# Altium footprint library vmorais_libraries.PcbLib: 95 footprints (part 5 of 6)
Each footprint in its own frame and in the unit in brackets; x right, y up, seen from the top. Pads: shape width x height; smd on the part's side, far side on the other; paste and mask are expansions set on the pad; w line width, h text height; cw(c..) or ccw(c..) is an arc to the next point about the centre after c.
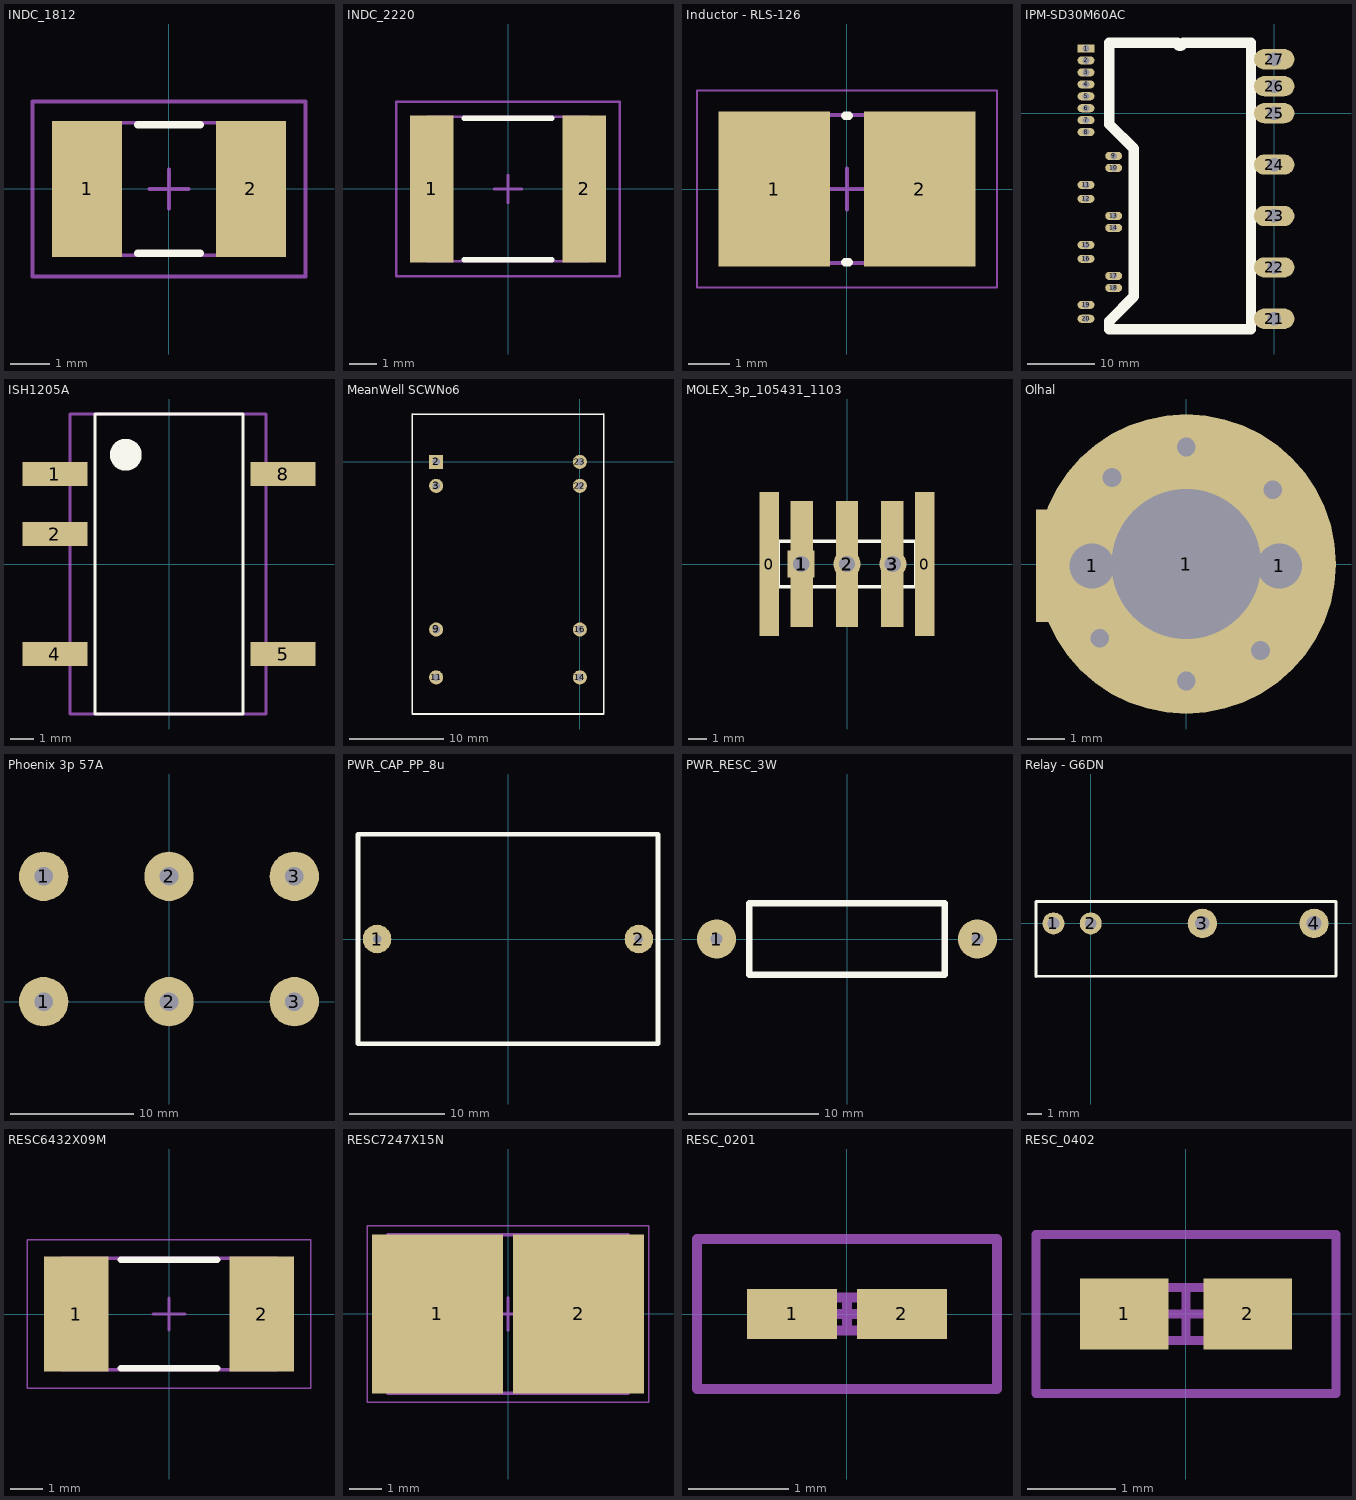
[diagram p4: the footprints below, top view; thin cyan lines are the x and y axes]

## INDC_1812 [mm] "Chip Inductor, Body 4.5x3.2mm, IPC Low Density"
height 1.35
pads (2):
  rect 1.8x3.5 smd: 1(-2.1,0) 2(2.1,0)
Top Overlay:
  lines w0.2: -0.8,-1.65 0.8,-1.65 ; -0.8,1.65 0.8,1.65
Mechanical 13:
  lines w0.1: -2.4,-1.7 2.4,-1.7 2.4,1.7 -2.4,1.7 -2.4,-1.7
Mechanical 15:
  lines w0.1: -0.5,0 0.5,0 ; 0,-0.5 0,0.5 ; -3.5,-2.25 3.5,-2.25 3.5,2.25 -3.5,2.25 -3.5,-2.25
3D body: height 1.35, standoff 0, extent -2.4,-1.7 2.4,1.7

## INDC_2220 [mm] "Chip Inductor, Body 5.7x5.0mm, IPC Low Density"
height 1.9
pads (2):
  rect 1.6x5.4 smd: 1(-2.8,0) 2(2.8,0)
Top Overlay:
  lines w0.2: -1.6,-2.6 1.6,-2.6 ; -1.6,2.6 1.6,2.6
Mechanical 13:
  lines w0.1: -2.95,-2.65 -2.95,2.65 2.95,2.65 2.95,-2.65 -2.95,-2.65
Mechanical 15:
  lines w0.1: -0.5,0 0.5,0 ; 0,-0.5 0,0.5 ; -4.1,-3.2 -4.1,3.2 4.1,3.2 4.1,-3.2 -4.1,-3.2
3D body: height 1.9, standoff 0, extent -2.95,-2.65 2.95,2.65

## Inductor - RLS-126 [mm]
pads (2):
  rect 2.72x3.77 smd: 1(-1.77,0) 2(1.77,0)
Top Overlay:
  lines w0.2: -0.05,-1.785 0.05,-1.785 ; -0.05,1.785 0.05,1.785
Mechanical 13:
  lines w0.1: -2.55,-1.8 2.55,-1.8 2.55,1.8 -2.55,1.8 -2.55,-1.8
Mechanical 15:
  lines w0.05: -3.65,-2.4 3.65,-2.4 3.65,2.4 -3.65,2.4 -3.65,-2.4
  lines w0.1: -0.5,0 0.5,0 ; 0,-0.5 0,0.5
3D body: height 2.6, standoff 0, extent 0.5,-1.8 2.55,1.8
3D body: height 2.6, standoff 0, extent -2.55,-1.8 -0.5,1.8
3D body: height 2.6, standoff 0, extent -0.5,-1.8 0.5,1.8

## IPM-SD30M60AC [mm]
pads (27):
  rect 2.5x1.2 hole 1: 1(-27.9,9.588)
  oval 2.5x1.2 hole 1: 2(-27.9,7.818) 3(-27.9,6.048) 4(-27.9,4.278) 5(-27.9,2.508) 6(-27.9,0.738) 7(-27.9,-1.032) 8(-27.9,-2.802) 9(-23.8,-6.342) 10(-23.8,-8.112) 11(-27.9,-10.643) 12(-27.9,-12.693) 13(-23.8,-15.224) 14(-23.8,-17.002) 15(-27.9,-19.54) 16(-27.9,-21.59) 17(-23.8,-24.121) 18(-23.8,-25.899) 19(-27.9,-28.43) 20(-27.9,-30.48)
  oval 6x3 hole 2: 21(0,-30.48) 22(0,-22.86) 23(0,-15.24) 24(0,-7.62) 25(0,0) 26(0,4) 27(0,8)
Top Overlay:
  lines w1.553: -24.462,-32.007 -3.438,-32.007 -3.438,10.473 -13.508,10.473 cw(c-13.95,10.473) -14.392,10.473 -24.462,10.473 -24.462,-1.608 -20.788,-5.282 -20.788,-9.126 -20.788,-13.444 -20.788,-18.778 -20.788,-22.588 -20.788,-27.16 -24.462,-30.834 -24.462,-32.007
3D body: height 5, standoff 1, extent -25.908,-32.766 -2.286,10.922

## ISH1205A [mm] "Isolated Module DC DC Converter 1 Output 5V 400mA 10.8V - 13.2V Input"
height 4.85
pads (5):
  rect 2.75x1 smd: 1(-4.83,3.81) 2(-4.83,1.27) 4(-4.83,-3.81) 5(4.83,-3.81) 8(4.83,3.81)
Top Overlay:
  circle w0.75: c-1.829,4.623 r0.3
  lines w0.127: -3.124,-6.35 3.124,-6.35 3.124,6.35 -3.124,6.35 -3.124,-6.35
Mechanical 1:
  lines w0.127: -4.195,-6.35 -4.195,6.35 4.111,6.35 4.111,-6.35 -4.195,-6.35
3D body: height 7.25, standoff 0, extent -4.195,-6.35 4.111,6.35

## MeanWell SCWNo6 [mm]
pads (8):
  rect 1.5x1.5 hole 0.8: 2(-15.24,0)
  round 1.5 hole 0.8: 3(-15.24,-2.54) 9(-15.24,-17.78) 11(-15.24,-22.86) 14(0,-22.86) 16(0,-17.78) 22(0,-2.54) 23(0,0)
Top Overlay:
  lines w0.2: -17.78,-26.746 2.54,-26.746 ; -17.78,-26.72 -17.78,5.08 ; -17.78,5.055 2.54,5.055 ; 2.54,-26.72 2.54,5.08
3D body: height 10.2, standoff 0.1, extent -17.653,-26.645 2.438,4.953

## MOLEX_3p_105431_1103 [mm] "conector 3p 2.5mm"
pads (8):
  rect 1.1x8 smd: 0(-4.305,0) 0(4.305,0)
  rect 1.5x1.5 hole 0.9: 1(-2.54,0)
  rect 1.24x7 smd: 1(-2.5,0) 2(0,0) 3(2.5,0)
  round 1.5 hole 0.9: 2(0,0) 3(2.54,0)
Top Overlay:
  lines w0.2: -3.81,-1.27 3.81,-1.27 3.81,1.27 -3.81,1.27 -3.81,-1.27
3D body "1054311103.step": height 11.3, standoff 0.14, extent -5.365,-4.136 5.365,4.115

## Olhal [mm]
pads (3):
  rect 3x3 hole 1.2: 1(-2.511,-0.051)
  round 8 hole 4 unplated: 1(0,0)
  round 3 hole 1.2: 1(2.489,-0.051)
via 0,3.124 diameter 0.6 hole 0.5
via 0,-3.124 diameter 0.6 hole 0.5
via 2.311,1.981 diameter 0.6 hole 0.5
via -1.981,2.311 diameter 0.6 hole 0.5
via -2.311,-1.981 diameter 0.6 hole 0.5
via 1.981,-2.311 diameter 0.6 hole 0.5

## Phoenix 3p 57A [mm]
pads (6):
  round 4 hole 1.5: 1(-10.16,0) 1(-10.16,10.16) 2(0,0) 2(0,10.16) 3(10.16,0) 3(10.16,10.16)
3D body "1929520_01.stp": height 31.25, standoff -4.5, extent -15.363,-3.407 15.972,18.593

## PWR_CAP_PP_8u [mm] "8uCAP"
height 1.35
pads (2):
  round 3 hole 0.9: 1(-13.75,0) 2(13.75,0)
Top Overlay:
  lines w0.5: -15.75,-11 15.75,-11 15.75,11 -15.75,11 -15.75,-11
3D body: height 37, standoff 0.5, extent -15.731,-10.973 15.739,10.973

## PWR_RESC_3W [mm] "RESC_3W"
height 1.35
pads (2):
  round 3 hole 0.9: 1(-10,0) 2(10,0)
Top Overlay:
  lines w0.5: -7.5,-2.75 -7.5,2.75 7.5,2.75 7.5,-2.75 -7.5,-2.75
3D body: height 11.5, standoff 0, extent -10.794,-0.798 -9.2,0.799
3D body: height 11.5, standoff 0, extent 9.206,-0.798 10.8,0.799
3D body: height 13.75, standoff 8.25, extent -7.602,-2.565 7.398,2.935
3D body: height 11.79, standoff 10.2, extent -10,-0.798 10,0.798

## Relay - G6DN [mm]
pads (4):
  round 1.5 hole 0.8: 1(-2.54,0)
  round 1.5 hole 0.8 paste+0: 2(0,0)
  round 2 hole 1: 3(7.62,0) 4(15.24,0)
Top Overlay:
  lines w0.2: -3.734,-3.617 -3.734,1.489 16.739,1.489 16.739,-3.591 -3.734,-3.617
3D body: height 13, standoff 0.5, extent -3.327,-3.531 16.51,1.422

## RESC6432X09M [mm] "Chip Resistor, 2-Leads, Body 6,40x3,20mm, IPC Low Density"
height 0.9
pads (2):
  rect 2x3.55 smd: 1(-2.875,0) 2(2.875,0)
Top Overlay:
  lines w0.2: -1.5,-1.675 1.5,-1.675 ; -1.5,1.675 1.5,1.675
Mechanical 13:
  lines w0.1: -3.325,-1.725 3.325,-1.725 3.325,1.725 -3.325,1.725 -3.325,-1.725
Mechanical 15:
  lines w0.05: -4.4,-2.3 4.4,-2.3 4.4,2.3 -4.4,2.3 -4.4,-2.3
  lines w0.1: -0.5,0 0.5,0 ; 0,-0.5 0,0.5
3D body "RESC6432X09M.step": height 0.9, standoff 0, extent -3.325,-1.725 3.325,1.725

## RESC7247X15N [mm] "Chip Resistor, 2-Leads, Body 7,22x4,72mm, IPC Medium Density"
height 1.5
pads (2):
  rect 4x4.85 smd: 1(-2.159,0) 2(2.159,0)
Mechanical 13:
  lines w0.1: -3.675,-2.425 -3.675,2.425 3.675,2.425 3.675,-2.425 -3.675,-2.425
Mechanical 15:
  lines w0.05: -4.3,-2.7 -4.3,2.7 4.3,2.7 4.3,-2.7 -4.3,-2.7
  lines w0.1: -0.5,0 0.5,0 ; 0,-0.5 0,0.5
3D body "RESC7247X15N.step": height 1.5, standoff 0, extent -3.675,-2.425 3.675,2.425

## RESC_0201 [mm] "Chip Resistor, Body 0.6x0.3mm, IPC Low Density"
height 0.3
pads (2):
  rect 0.9x0.5 smd: 1(-0.55,0) 2(0.55,0)
Mechanical 13:
  lines w0.1: -0.315,-0.165 0.315,-0.165 0.315,0.165 -0.315,0.165 -0.315,-0.165
Mechanical 15:
  lines w0.1: -0.165,0 0.165,0 ; 0,-0.165 0,0.165 ; -1.5,-0.75 1.5,-0.75 1.5,0.75 -1.5,0.75 -1.5,-0.75
3D body: height 0.3, standoff 0, extent -0.315,-0.165 0.315,0.165

## RESC_0402 [mm] "Chip Resistor, Body 1.1x0.5mm, IPC Low Density"
height 0.4
pads (2):
  rect 1x0.8 smd: 1(-0.7,0) 2(0.7,0)
Mechanical 13:
  lines w0.1: -0.55,-0.3 0.55,-0.3 0.55,0.3 -0.55,0.3 -0.55,-0.3
Mechanical 15:
  lines w0.1: -0.3,0 0.3,0 ; 0,-0.3 0,0.3 ; -1.7,-0.9 1.7,-0.9 1.7,0.9 -1.7,0.9 -1.7,-0.9
3D body: height 0.4, standoff 0, extent -0.55,-0.3 0.55,0.3